# Altium schematic symbol library TI Amplifiers and Linear Special Function Amplifier.SchLib: 708 symbols (part 6 of 34) (continued)
## TAS5086DBT (continued)

## TAS5086DBTG4
designator U?
6 Channel Digital Audio PWM Processor, 0 to 70 degC, 38-pin SOP (DBT38), Green (RoHS & no Sb/Br); Manufacturer: Texas Instruments; PartNumber: TAS5086DBTG4; Audio Output Channels (PWM)(#): 6; Data Resolution: 16, 20, 24; Digital Input: TRUE; Digital Supply (up to 5 V)(Max)(V): 3.6; Digital Supply (up to 5 V)(Min)(V): 3; Dynamic Range(dB): 105; Fs(Max)(kHz): 192; Fs(Min)(kHz): 32; Input / Output Channel Mux: Yes / Yes; Mute: Yes; Output: PWM, I2S; Serial Interface: I2S, R, L; DatasheetVersion: SLES131C; PackageVersion: 4073252-6/I, 03/2011; PackageReference: DBT38; PackageDescription: 38-Pin Plastic Small Outline, Body 9.7 x 4.4 mm, Pitch 0.5 mm; Supplier 1: Digi-Key; Supplier Part Number 1: TAS5086DBTG4-ND; Supplier 2: Newark; Supplier Part Number 2: 54K0684; Supplier 3: Mouser; Supplier Part Number 3: 595-TAS5086DBTG4; Eco-Plan: Green (RoHS & no Sb/Br); Loudness Compensation: No; PurePath: TRUE; SubFamily: PWM Processor; Volume Control: Yes; Mounting Technology: Surface Mount; Code_JEDEC: MO-153; ComponentLink1Description: Manufacturer URL; ComponentLink1URL: http://www.ti.com/; ComponentLink2Description: Datasheet; ComponentLink2URL: http://www.ti.com/general/docs/lit/getliterature.tsp?genericPartNumber=TAS5086&fileType=pdf; ComponentLink3Description: Package Specification; ComponentLink3URL: http://www.ti.com/litv/pdf/mpds368
footprint TI-DBT38_N (SOP, 38-Leads, Body 9.7x4.4mm, Pitch 0.5mm, IPC Medium Density)
footprint TI-DBT38_L (SOP, 38-Leads, Body 9.7x4.4mm, Pitch 0.5mm, IPC High Density)
footprint TI-DBT38_M (SOP, 38-Leads, Body 9.7x4.4mm, Pitch 0.5mm, IPC Low Density)
pins: 1 VR_ANA (power) "Voltage reference for analog supply, 1.8 V. A pinout of the internally regulated 1.8-V power. A 0.1-uF, low-ESR capacitor should be connected between this terminal and AVSS_PLL. This terminal must not be used to power (See Datasheet)", 2 AVDD (power) "3.3-V analog power supply", 3 AVSS (power) "Analog supply ground", 4 AVSS (power) "Analog supply ground", 5 PLL_FLTM "PLL negative input", 6 PLL_FLTP "PLL positive input", 7 AVSS (power) "Analog supply ground", 8 MCLK (in) "MCLK is a 3.3-V clock master clock input. The input frequency of this clock can range from 4 MHz to 50 MHz.", 9 ~{RESET} (in) "A system reset is generated by applying a logic low to this terminal.R\E\S\E\T\ is an asynchronous control signal that restores the TAS5086 to its default conditions, sets the VALID2 output low, and places the PWM in the (See Datasheet)", 10 ~{PDN} (in) "Power down, active-low. P\D\N\ powers down all logic, stops all clocks, and performs a soft stop whenever a logic low is applied. The internal parameters are preserved through a power-down cycle, as long as R\E\S\E\T\ is not (See Datasheet)", 11 DVDD (power) "3.3-V digital power supply", 12 DVSS (power) "Digital ground", 13 DVSS_OSC (power) "Digital ground for oscillator", 14 OSC_RES "Oscillator trim resistor", 15 VR_OSC (power) "Voltage reference for analog supply, 1.8 V. A pinout of the internally regulated 1.8-V power. A 0.1-uF, low-ESR(3)capacitor should be connected between this terminal and AVSS_PLL. This terminal must not be used to power (See Datasheet)", 16 ~{MUTE} (in) "Performs a soft mute of outputs, active-low (muted signal = a logic low,normal operation = a logic high). The mute control provides a noiseless volume ramp to silence. Releasing mute provides a noiseless ramp to previous (See Datasheet)", 17 SDA (io) "I2C serial control data interface input/output", 18 SCL (in) "I2C serial control clock input", 19 LRCLK (in) "Input serial audio data left/right clock (sampling rate clock)", 20 SCLK (in) "Serial audio data clock (shift clock). SCLKIN is the serial audio port (SAP) input data bit clock.", 21 RESERVED (power) "RESERVED (connect to ground)", 22 SDOUT (out) "Serial audio data 1 output is the only serial data output port. SDOUT supports I2S format only.", 23 SDIN4 (in) "Serial audio data 4 input is one of the serial data input ports. SDIN4 supports four discrete (stereo) data formats.", 24 SDIN3 (in) "Serial audio data 3 input is one of the serial data input ports. SDIN3 supports four discrete (stereo) data formats.", 25 SDIN2 (in) "Serial audio data 2 input is one of the serial data input ports. SDIN2 supports four discrete (stereo) data formats.", 26 SDIN1 (in) "Serial audio data 1 input is one of the serial data input ports. SDIN1 supports four discrete (stereo) data formats.", 27 ~{BKND_ERR} (in) "Active-low. A back-end error sequence is generated by applying logic LOW to this terminal. B\K\N\D\_\E\R\R\ results in no change to any system parameters while VALID2 goes low.", 28 DVSS (power) "Digital ground", 29 DVSS (power) "Digital ground", 30 VR_DIG (power) "Voltage reference for digital PWM core supply, 1.8 V. A pinout of the internally regulated 1.8-V power used by digital PWM core logic. A 0.1-uF,low-ESR(3)capacitor should be connected between this terminal and DVSS_PWM. This (See Datasheet)", 31 VALID1 (out) "Soft start valid. Output indicating validity of soft-start PWM output, active-high", 32 VALID2 (out) "Output indicating validity of PWM outputs, active-high.", 33 PWM_6 (hiz) "PWM 6 output", 34 PWM_5 (hiz) "PWM 5 output", 35 PWM_4 (hiz) "PWM 4 output", 36 PWM_3 (hiz) "PWM 3 output", 37 PWM_2 (hiz) "PWM 2 output", 38 PWM_1 (hiz) "PWM 1 output"

## TAS5086DBTR
designator U?
6 Channel Digital Audio PWM Processor, 0 to 70 degC, 38-pin SOP (DBT38), Green (RoHS & no Sb/Br); Manufacturer: Texas Instruments; PartNumber: TAS5086DBTR; Audio Output Channels (PWM)(#): 6; Data Resolution: 16, 20, 24; Digital Input: TRUE; Digital Supply (up to 5 V)(Max)(V): 3.6; Digital Supply (up to 5 V)(Min)(V): 3; Dynamic Range(dB): 105; Fs(Max)(kHz): 192; Fs(Min)(kHz): 32; Input / Output Channel Mux: Yes / Yes; Mute: Yes; Output: PWM, I2S; Serial Interface: I2S, R, L; DatasheetVersion: SLES131C; PackageVersion: 4073252-6/I, 03/2011; PackageReference: DBT38; PackageDescription: 38-Pin Plastic Small Outline, Body 9.7 x 4.4 mm, Pitch 0.5 mm; Supplier 1: Digi-Key; Supplier Part Number 1: 296-26678-2-ND; Supplier 2: Digi-Key; Supplier Part Number 2: 296-26678-1-ND; Supplier 3: Digi-Key; Supplier Part Number 3: 296-26678-6-ND; Supplier 4: Newark; Supplier Part Number 4: 24K4910; Supplier 5: Mouser; Supplier Part Number 5: 595-TAS5086DBTR; Eco-Plan: Green (RoHS & no Sb/Br); Loudness Compensation: No; PurePath: TRUE; SubFamily: PWM Processor; Volume Control: Yes; Mounting Technology: Surface Mount; Code_JEDEC: MO-153; ComponentLink1Description: Manufacturer URL; ComponentLink1URL: http://www.ti.com/; ComponentLink2Description: Datasheet; ComponentLink2URL: http://www.ti.com/general/docs/lit/getliterature.tsp?genericPartNumber=TAS5086&fileType=pdf; ComponentLink3Description: Package Specification; ComponentLink3URL: http://www.ti.com/litv/pdf/mpds368
footprint TI-DBT38_N (SOP, 38-Leads, Body 9.7x4.4mm, Pitch 0.5mm, IPC Medium Density)
footprint TI-DBT38_L (SOP, 38-Leads, Body 9.7x4.4mm, Pitch 0.5mm, IPC High Density)
footprint TI-DBT38_M (SOP, 38-Leads, Body 9.7x4.4mm, Pitch 0.5mm, IPC Low Density)
pins: 1 VR_ANA (power) "Voltage reference for analog supply, 1.8 V. A pinout of the internally regulated 1.8-V power. A 0.1-uF, low-ESR capacitor should be connected between this terminal and AVSS_PLL. This terminal must not be used to power (See Datasheet)", 2 AVDD (power) "3.3-V analog power supply", 3 AVSS (power) "Analog supply ground", 4 AVSS (power) "Analog supply ground", 5 PLL_FLTM "PLL negative input", 6 PLL_FLTP "PLL positive input", 7 AVSS (power) "Analog supply ground", 8 MCLK (in) "MCLK is a 3.3-V clock master clock input. The input frequency of this clock can range from 4 MHz to 50 MHz.", 9 ~{RESET} (in) "A system reset is generated by applying a logic low to this terminal.R\E\S\E\T\ is an asynchronous control signal that restores the TAS5086 to its default conditions, sets the VALID2 output low, and places the PWM in the (See Datasheet)", 10 ~{PDN} (in) "Power down, active-low. P\D\N\ powers down all logic, stops all clocks, and performs a soft stop whenever a logic low is applied. The internal parameters are preserved through a power-down cycle, as long as R\E\S\E\T\ is not (See Datasheet)", 11 DVDD (power) "3.3-V digital power supply", 12 DVSS (power) "Digital ground", 13 DVSS_OSC (power) "Digital ground for oscillator", 14 OSC_RES "Oscillator trim resistor", 15 VR_OSC (power) "Voltage reference for analog supply, 1.8 V. A pinout of the internally regulated 1.8-V power. A 0.1-uF, low-ESR(3)capacitor should be connected between this terminal and AVSS_PLL. This terminal must not be used to power (See Datasheet)", 16 ~{MUTE} (in) "Performs a soft mute of outputs, active-low (muted signal = a logic low,normal operation = a logic high). The mute control provides a noiseless volume ramp to silence. Releasing mute provides a noiseless ramp to previous (See Datasheet)", 17 SDA (io) "I2C serial control data interface input/output", 18 SCL (in) "I2C serial control clock input", 19 LRCLK (in) "Input serial audio data left/right clock (sampling rate clock)", 20 SCLK (in) "Serial audio data clock (shift clock). SCLKIN is the serial audio port (SAP) input data bit clock.", 21 RESERVED (power) "RESERVED (connect to ground)", 22 SDOUT (out) "Serial audio data 1 output is the only serial data output port. SDOUT supports I2S format only.", 23 SDIN4 (in) "Serial audio data 4 input is one of the serial data input ports. SDIN4 supports four discrete (stereo) data formats.", 24 SDIN3 (in) "Serial audio data 3 input is one of the serial data input ports. SDIN3 supports four discrete (stereo) data formats.", 25 SDIN2 (in) "Serial audio data 2 input is one of the serial data input ports. SDIN2 supports four discrete (stereo) data formats.", 26 SDIN1 (in) "Serial audio data 1 input is one of the serial data input ports. SDIN1 supports four discrete (stereo) data formats.", 27 ~{BKND_ERR} (in) "Active-low. A back-end error sequence is generated by applying logic LOW to this terminal. B\K\N\D\_\E\R\R\ results in no change to any system parameters while VALID2 goes low.", 28 DVSS (power) "Digital ground", 29 DVSS (power) "Digital ground", 30 VR_DIG (power) "Voltage reference for digital PWM core supply, 1.8 V. A pinout of the internally regulated 1.8-V power used by digital PWM core logic. A 0.1-uF,low-ESR(3)capacitor should be connected between this terminal and DVSS_PWM. This (See Datasheet)", 31 VALID1 (out) "Soft start valid. Output indicating validity of soft-start PWM output, active-high", 32 VALID2 (out) "Output indicating validity of PWM outputs, active-high.", 33 PWM_6 (hiz) "PWM 6 output", 34 PWM_5 (hiz) "PWM 5 output", 35 PWM_4 (hiz) "PWM 4 output", 36 PWM_3 (hiz) "PWM 3 output", 37 PWM_2 (hiz) "PWM 2 output", 38 PWM_1 (hiz) "PWM 1 output"

## TAS5086DBTRG4
designator U?
6 Channel Digital Audio PWM Processor, 0 to 70 degC, 38-pin SOP (DBT38), Green (RoHS & no Sb/Br); Manufacturer: Texas Instruments; PartNumber: TAS5086DBTRG4; Audio Output Channels (PWM)(#): 6; Data Resolution: 16, 20, 24; Digital Input: TRUE; Digital Supply (up to 5 V)(Max)(V): 3.6; Digital Supply (up to 5 V)(Min)(V): 3; Dynamic Range(dB): 105; Fs(Max)(kHz): 192; Fs(Min)(kHz): 32; Input / Output Channel Mux: Yes / Yes; Mute: Yes; Output: PWM, I2S; Serial Interface: I2S, R, L; DatasheetVersion: SLES131C; PackageVersion: 4073252-6/I, 03/2011; PackageReference: DBT38; PackageDescription: 38-Pin Plastic Small Outline, Body 9.7 x 4.4 mm, Pitch 0.5 mm; Supplier 1: Digi-Key; Supplier Part Number 1: TAS5086DBTRG4-ND; Supplier 2: Newark; Supplier Part Number 2: 33K6856; Supplier 3: Mouser; Supplier Part Number 3: 595-TAS5086DBTRG4; Eco-Plan: Green (RoHS & no Sb/Br); Loudness Compensation: No; PurePath: TRUE; SubFamily: PWM Processor; Volume Control: Yes; Mounting Technology: Surface Mount; Code_JEDEC: MO-153; ComponentLink1Description: Manufacturer URL; ComponentLink1URL: http://www.ti.com/; ComponentLink2Description: Datasheet; ComponentLink2URL: http://www.ti.com/general/docs/lit/getliterature.tsp?genericPartNumber=TAS5086&fileType=pdf; ComponentLink3Description: Package Specification; ComponentLink3URL: http://www.ti.com/litv/pdf/mpds368
footprint TI-DBT38_N (SOP, 38-Leads, Body 9.7x4.4mm, Pitch 0.5mm, IPC Medium Density)
footprint TI-DBT38_L (SOP, 38-Leads, Body 9.7x4.4mm, Pitch 0.5mm, IPC High Density)
footprint TI-DBT38_M (SOP, 38-Leads, Body 9.7x4.4mm, Pitch 0.5mm, IPC Low Density)
pins: 1 VR_ANA (power) "Voltage reference for analog supply, 1.8 V. A pinout of the internally regulated 1.8-V power. A 0.1-uF, low-ESR capacitor should be connected between this terminal and AVSS_PLL. This terminal must not be used to power (See Datasheet)", 2 AVDD (power) "3.3-V analog power supply", 3 AVSS (power) "Analog supply ground", 4 AVSS (power) "Analog supply ground", 5 PLL_FLTM "PLL negative input", 6 PLL_FLTP "PLL positive input", 7 AVSS (power) "Analog supply ground", 8 MCLK (in) "MCLK is a 3.3-V clock master clock input. The input frequency of this clock can range from 4 MHz to 50 MHz.", 9 ~{RESET} (in) "A system reset is generated by applying a logic low to this terminal.R\E\S\E\T\ is an asynchronous control signal that restores the TAS5086 to its default conditions, sets the VALID2 output low, and places the PWM in the (See Datasheet)", 10 ~{PDN} (in) "Power down, active-low. P\D\N\ powers down all logic, stops all clocks, and performs a soft stop whenever a logic low is applied. The internal parameters are preserved through a power-down cycle, as long as R\E\S\E\T\ is not (See Datasheet)", 11 DVDD (power) "3.3-V digital power supply", 12 DVSS (power) "Digital ground", 13 DVSS_OSC (power) "Digital ground for oscillator", 14 OSC_RES "Oscillator trim resistor", 15 VR_OSC (power) "Voltage reference for analog supply, 1.8 V. A pinout of the internally regulated 1.8-V power. A 0.1-uF, low-ESR(3)capacitor should be connected between this terminal and AVSS_PLL. This terminal must not be used to power (See Datasheet)", 16 ~{MUTE} (in) "Performs a soft mute of outputs, active-low (muted signal = a logic low,normal operation = a logic high). The mute control provides a noiseless volume ramp to silence. Releasing mute provides a noiseless ramp to previous (See Datasheet)", 17 SDA (io) "I2C serial control data interface input/output", 18 SCL (in) "I2C serial control clock input", 19 LRCLK (in) "Input serial audio data left/right clock (sampling rate clock)", 20 SCLK (in) "Serial audio data clock (shift clock). SCLKIN is the serial audio port (SAP) input data bit clock.", 21 RESERVED (power) "RESERVED (connect to ground)", 22 SDOUT (out) "Serial audio data 1 output is the only serial data output port. SDOUT supports I2S format only.", 23 SDIN4 (in) "Serial audio data 4 input is one of the serial data input ports. SDIN4 supports four discrete (stereo) data formats.", 24 SDIN3 (in) "Serial audio data 3 input is one of the serial data input ports. SDIN3 supports four discrete (stereo) data formats.", 25 SDIN2 (in) "Serial audio data 2 input is one of the serial data input ports. SDIN2 supports four discrete (stereo) data formats.", 26 SDIN1 (in) "Serial audio data 1 input is one of the serial data input ports. SDIN1 supports four discrete (stereo) data formats.", 27 ~{BKND_ERR} (in) "Active-low. A back-end error sequence is generated by applying logic LOW to this terminal. B\K\N\D\_\E\R\R\ results in no change to any system parameters while VALID2 goes low.", 28 DVSS (power) "Digital ground", 29 DVSS (power) "Digital ground", 30 VR_DIG (power) "Voltage reference for digital PWM core supply, 1.8 V. A pinout of the internally regulated 1.8-V power used by digital PWM core logic. A 0.1-uF,low-ESR(3)capacitor should be connected between this terminal and DVSS_PWM. This (See Datasheet)", 31 VALID1 (out) "Soft start valid. Output indicating validity of soft-start PWM output, active-high", 32 VALID2 (out) "Output indicating validity of PWM outputs, active-high.", 33 PWM_6 (hiz) "PWM 6 output", 34 PWM_5 (hiz) "PWM 5 output", 35 PWM_4 (hiz) "PWM 4 output", 36 PWM_3 (hiz) "PWM 3 output", 37 PWM_2 (hiz) "PWM 2 output", 38 PWM_1 (hiz) "PWM 1 output"

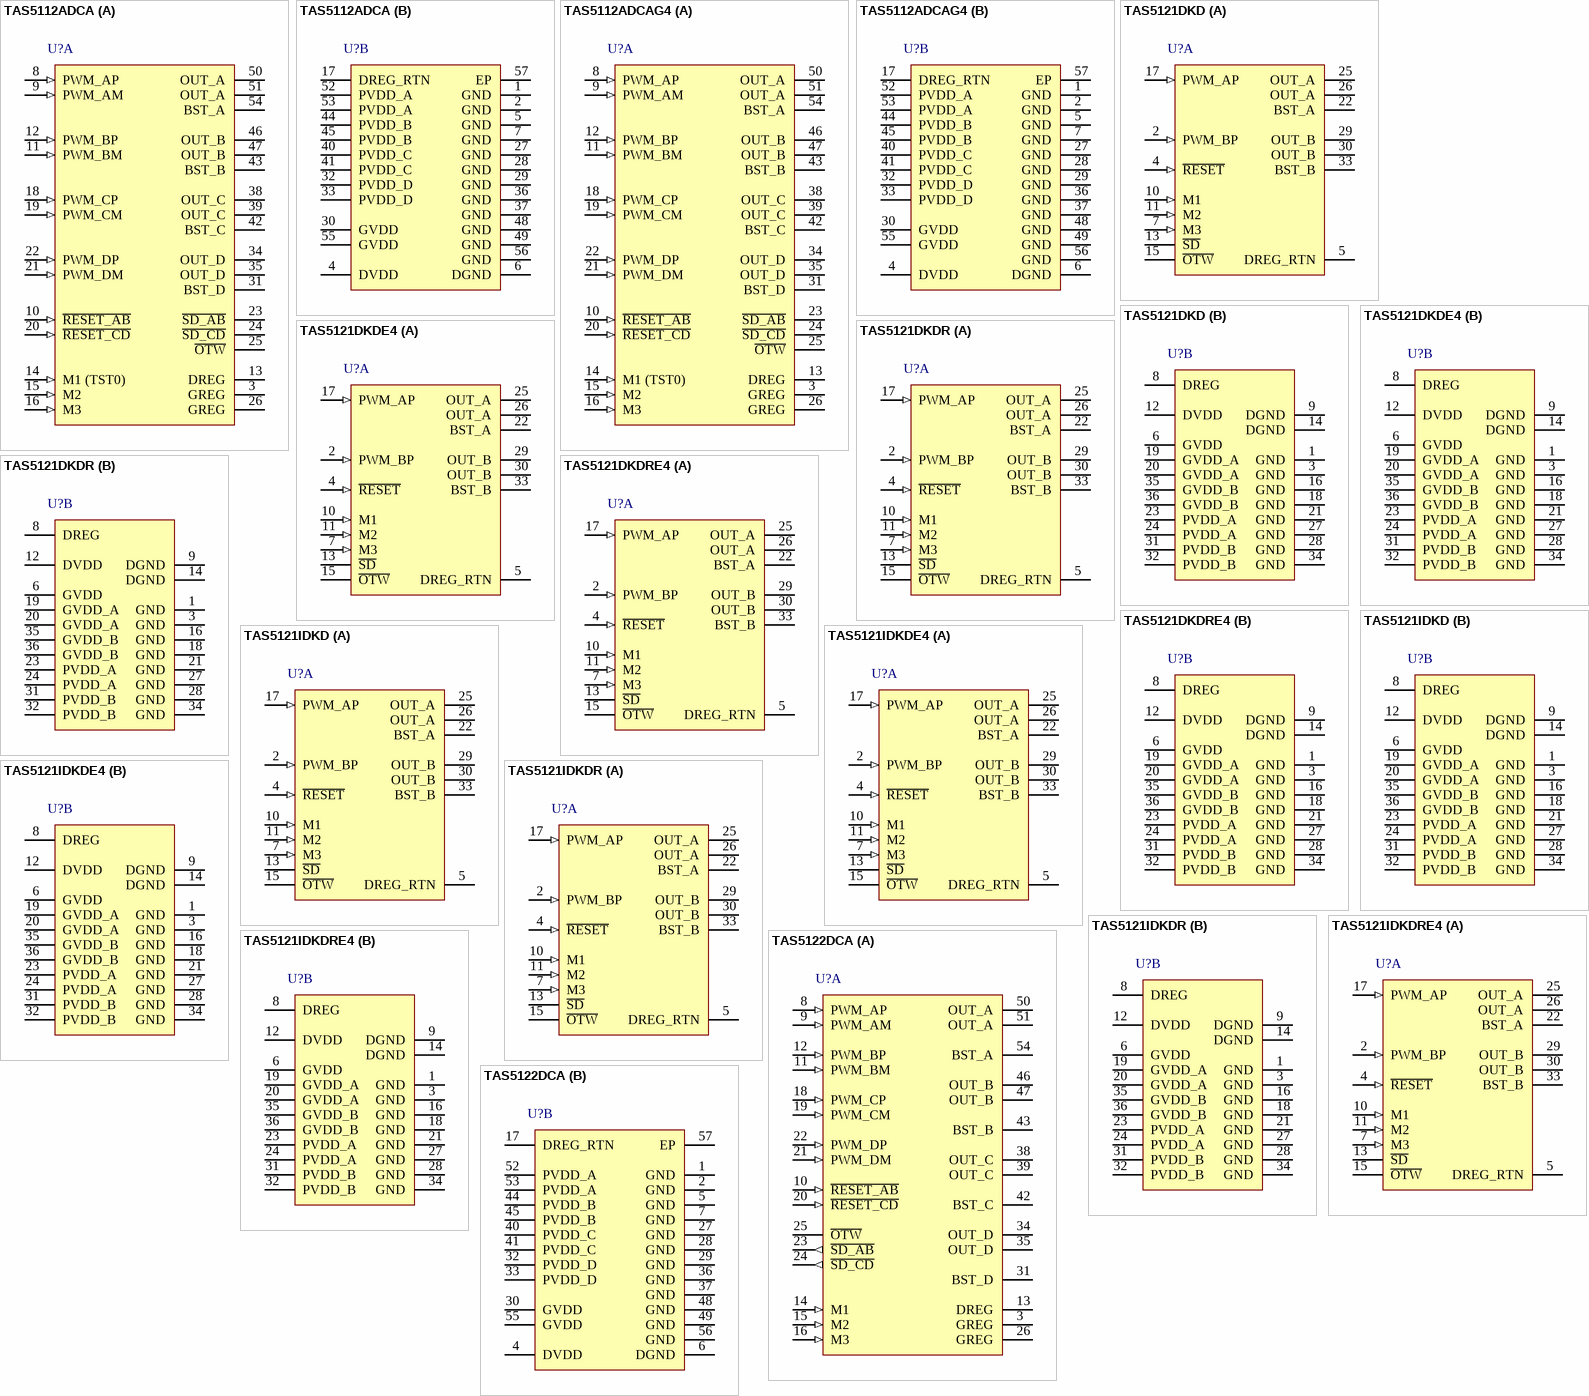
[diagram p8: symbols TAS5112ADCA to TAS5122DCA]

## TAS5112ADCA
designator U?
50 W Stereo Digital Amplifier Power Stage, 0 to 70 degC, 56-pin SOP (DCA56), Green (RoHS & no Sb/Br); Manufacturer: Texas Instruments; PartNumber: TAS5112ADCA; Analog Supply Max [V]: 30.5; Analog Supply Min [V]: 16; Digital Supply Min [V]: 3; Input Type: PWM; Max. Number of Speaker Outputs: 2; SubFamily: Mid/High-Power Amplifier; DatasheetVersion: SLES094B; PackageVersion: 4073259-3/E, 07/2011; PackageReference: DCA56-7700X3425TP; PackageDescription: 56-Pin Plastic Small Outline, Body 14 x 6.1 mm, Pitch 0.5 mm; Supplier 1: Digi-Key; Supplier Part Number 1: 296-17673-5-ND; Supplier 2: Farnell; Supplier Part Number 2: 1534651; Supplier 3: Newark; Supplier Part Number 3: 73J8317; Supplier 4: Mouser; Supplier Part Number 4: 595-TAS5112ADCA; Eco-Plan: Green (RoHS & no Sb/Br); Mounting Technology: Surface Mount; Code_JEDEC: MO-153; ComponentLink1Description: Manufacturer URL; ComponentLink1URL: http://www.ti.com/; ComponentLink2Description: Datasheet; ComponentLink2URL: http://www.ti.com/general/docs/lit/getliterature.tsp?genericPartNumber=TAS5112A&fileType=pdf; ComponentLink3Description: Package Specification; ComponentLink3URL: http://www.ti.com/litv/pdf/mpdi001b
footprint TI-DCA56-7700X3425TP_N (SOP, 56-Leads, Body 14x6.1mm, Pitch 0.5mm, Thermal Pad 8.2x3.9mm, IPC Medium Density)
footprint TI-DCA56-7700X3425TP_L (SOP, 56-Leads, Body 14x6.1mm, Pitch 0.5mm, Thermal Pad 8.2x3.9mm, IPC High Density)
footprint TI-DCA56-7700X3425TP_M (SOP, 56-Leads, Body 14x6.1mm, Pitch 0.5mm, Thermal Pad 8.2x3.9mm, IPC Low Density)
part A pins: 3 GREG "Gate drive voltage regulator decoupling pin, capacitor to REG_GND", 8 PWM_AP (in) "Input signal (positive), half-bridge A", 9 PWM_AM (in) "Input signal (negative), half-bridge A", 10 ~{RESET_AB} (in) "Reset signal, active low", 11 PWM_BM (in) "Input signal (negative), half-bridge B", 12 PWM_BP (in) "Input signal (positive), half-bridge B", 13 DREG "Digital supply voltage regulator decoupling pin, capacitor connected to GND", 14 M1 (TST0) (in) "Mode selection pin", 15 M2 (in) "Mode selection pin", 16 M3 (in) "Mode selection pin", 18 PWM_CP (in) "Input signal (positive), half-bridge C", 19 PWM_CM (in) "Input signal (negative), half-bridge C", 20 ~{RESET_CD} (in) "Reset signal, active low", 21 PWM_DM (in) "Input signal (negative), half-bridge D", 22 PWM_DP (in) "Input signal (positive), half-bridge D", 23 ~{SD_AB} (oc) "Shutdown signal for half-bridges A and B, active-low", 24 ~{SD_CD} (oc) "Shutdown signal for half-bridges C and D, active-low", 25 ~{OTW} (oc) "Overtemperature warning output, open drain with internal pullup resistor", 26 GREG "Gate drive voltage regulator decoupling pin, capacitor to REG_GND", 31 BST_D "HS bootstrap supply (BST), external capacitor to OUT_D required", 34 OUT_D (hiz) "Output, half-bridge D", 35 OUT_D (hiz) "Output, half-bridge D", 38 OUT_C (hiz) "Output, half-bridge C", 39 OUT_C (hiz) "Output, half-bridge C", 42 BST_C "HS bootstrap supply (BST), external capacitor to OUT_C required", 43 BST_B "High-side bootstrap supply (BST), external capacitor to OUT_B required", 46 OUT_B (hiz) "Output, half-bridge B", 47 OUT_B (hiz) "Output, half-bridge B", 50 OUT_A (hiz) "Output, half-bridge A", 51 OUT_A (hiz) "Output, half-bridge A", 54 BST_A "High-side bootstrap supply (BST), external capacitor to OUT_A required"
part B pins: 1 GND (power) "Power ground", 2 GND (power) "Power ground", 4 DVDD (power) "I/O reference supply input (3.3 V)", 5 GND (power) "Power ground", 6 DGND (power) "Digital I/O reference ground", 7 GND (power) "Power ground", 17 DREG_RTN (power) "Digital supply voltage regulator decoupling return pin", 27 GND (power) "Power ground", 28 GND (power) "Power ground", 29 GND (power) "Power ground", 30 GVDD (power) "Voltage supply to on-chip gate drive and digital supply voltage regulators", 32 PVDD_D (power) "Power supply input for half-bridge D", 33 PVDD_D (power) "Power supply input for half-bridge D", 36 GND (power) "Power ground", 37 GND (power) "Power ground", 40 PVDD_C (power) "Power supply input for half-bridge C", 41 PVDD_C (power) "Power supply input for half-bridge C", 44 PVDD_B (power) "Power supply input for half-bridge B", 45 PVDD_B (power) "Power supply input for half-bridge B", 48 GND (power) "Power ground", 49 GND (power) "Power ground", 52 PVDD_A (power) "Power supply input for half-bridge A", 53 PVDD_A (power) "Power supply input for half-bridge A", 55 GVDD (power) "Voltage supply to on-chip gate drive and digital supply voltage regulators", 56 GND (power) "Power ground", 57 EP

## TAS5112ADCAG4
designator U?
50 W Stereo Digital Amplifier Power Stage, 0 to 70 degC, 56-pin SOP (DCA56), Green (RoHS & no Sb/Br); Manufacturer: Texas Instruments; PartNumber: TAS5112ADCAG4; Analog Supply Max [V]: 30.5; Analog Supply Min [V]: 16; Digital Supply Min [V]: 3; Input Type: PWM; Max. Number of Speaker Outputs: 2; SubFamily: Mid/High-Power Amplifier; DatasheetVersion: SLES094B; PackageVersion: 4073259-3/E, 07/2011; PackageReference: DCA56-7700X3425TP; PackageDescription: 56-Pin Plastic Small Outline, Body 14 x 6.1 mm, Pitch 0.5 mm; Supplier 1: Digi-Key; Supplier Part Number 1: TAS5112ADCAG4-ND; Supplier 2: Mouser; Supplier Part Number 2: 595-TAS5112ADCAG4; Eco-Plan: Green (RoHS & no Sb/Br); Mounting Technology: Surface Mount; Code_JEDEC: MO-153; ComponentLink1Description: Manufacturer URL; ComponentLink1URL: http://www.ti.com/; ComponentLink2Description: Datasheet; ComponentLink2URL: http://www.ti.com/general/docs/lit/getliterature.tsp?genericPartNumber=TAS5112A&fileType=pdf; ComponentLink3Description: Package Specification; ComponentLink3URL: http://www.ti.com/litv/pdf/mpdi001b
footprint TI-DCA56-7700X3425TP_N (SOP, 56-Leads, Body 14x6.1mm, Pitch 0.5mm, Thermal Pad 8.2x3.9mm, IPC Medium Density)
footprint TI-DCA56-7700X3425TP_L (SOP, 56-Leads, Body 14x6.1mm, Pitch 0.5mm, Thermal Pad 8.2x3.9mm, IPC High Density)
footprint TI-DCA56-7700X3425TP_M (SOP, 56-Leads, Body 14x6.1mm, Pitch 0.5mm, Thermal Pad 8.2x3.9mm, IPC Low Density)
part A pins: 3 GREG "Gate drive voltage regulator decoupling pin, capacitor to REG_GND", 8 PWM_AP (in) "Input signal (positive), half-bridge A", 9 PWM_AM (in) "Input signal (negative), half-bridge A", 10 ~{RESET_AB} (in) "Reset signal, active low", 11 PWM_BM (in) "Input signal (negative), half-bridge B", 12 PWM_BP (in) "Input signal (positive), half-bridge B", 13 DREG "Digital supply voltage regulator decoupling pin, capacitor connected to GND", 14 M1 (TST0) (in) "Mode selection pin", 15 M2 (in) "Mode selection pin", 16 M3 (in) "Mode selection pin", 18 PWM_CP (in) "Input signal (positive), half-bridge C", 19 PWM_CM (in) "Input signal (negative), half-bridge C", 20 ~{RESET_CD} (in) "Reset signal, active low", 21 PWM_DM (in) "Input signal (negative), half-bridge D", 22 PWM_DP (in) "Input signal (positive), half-bridge D", 23 ~{SD_AB} (oc) "Shutdown signal for half-bridges A and B, active-low", 24 ~{SD_CD} (oc) "Shutdown signal for half-bridges C and D, active-low", 25 ~{OTW} (oc) "Overtemperature warning output, open drain with internal pullup resistor", 26 GREG "Gate drive voltage regulator decoupling pin, capacitor to REG_GND", 31 BST_D "HS bootstrap supply (BST), external capacitor to OUT_D required", 34 OUT_D (hiz) "Output, half-bridge D", 35 OUT_D (hiz) "Output, half-bridge D", 38 OUT_C (hiz) "Output, half-bridge C", 39 OUT_C (hiz) "Output, half-bridge C", 42 BST_C "HS bootstrap supply (BST), external capacitor to OUT_C required", 43 BST_B "High-side bootstrap supply (BST), external capacitor to OUT_B required", 46 OUT_B (hiz) "Output, half-bridge B", 47 OUT_B (hiz) "Output, half-bridge B", 50 OUT_A (hiz) "Output, half-bridge A", 51 OUT_A (hiz) "Output, half-bridge A", 54 BST_A "High-side bootstrap supply (BST), external capacitor to OUT_A required"
part B pins: 1 GND (power) "Power ground", 2 GND (power) "Power ground", 4 DVDD (power) "I/O reference supply input (3.3 V)", 5 GND (power) "Power ground", 6 DGND (power) "Digital I/O reference ground", 7 GND (power) "Power ground", 17 DREG_RTN (power) "Digital supply voltage regulator decoupling return pin", 27 GND (power) "Power ground", 28 GND (power) "Power ground", 29 GND (power) "Power ground", 30 GVDD (power) "Voltage supply to on-chip gate drive and digital supply voltage regulators", 32 PVDD_D (power) "Power supply input for half-bridge D", 33 PVDD_D (power) "Power supply input for half-bridge D", 36 GND (power) "Power ground", 37 GND (power) "Power ground", 40 PVDD_C (power) "Power supply input for half-bridge C", 41 PVDD_C (power) "Power supply input for half-bridge C", 44 PVDD_B (power) "Power supply input for half-bridge B", 45 PVDD_B (power) "Power supply input for half-bridge B", 48 GND (power) "Power ground", 49 GND (power) "Power ground", 52 PVDD_A (power) "Power supply input for half-bridge A", 53 PVDD_A (power) "Power supply input for half-bridge A", 55 GVDD (power) "Voltage supply to on-chip gate drive and digital supply voltage regulators", 56 GND (power) "Power ground", 57 EP